# Altium footprint library SMD_SEMI.PcbLib: 101 footprints (part 2 of 7)
Each footprint in its own frame and in the unit in brackets; x right, y up, seen from the top. Pads: shape width x height; smd on the part's side, far side on the other; paste and mask are expansions set on the pad; w line width, h text height; cw(c..) or ccw(c..) is an arc to the next point about the centre after c.
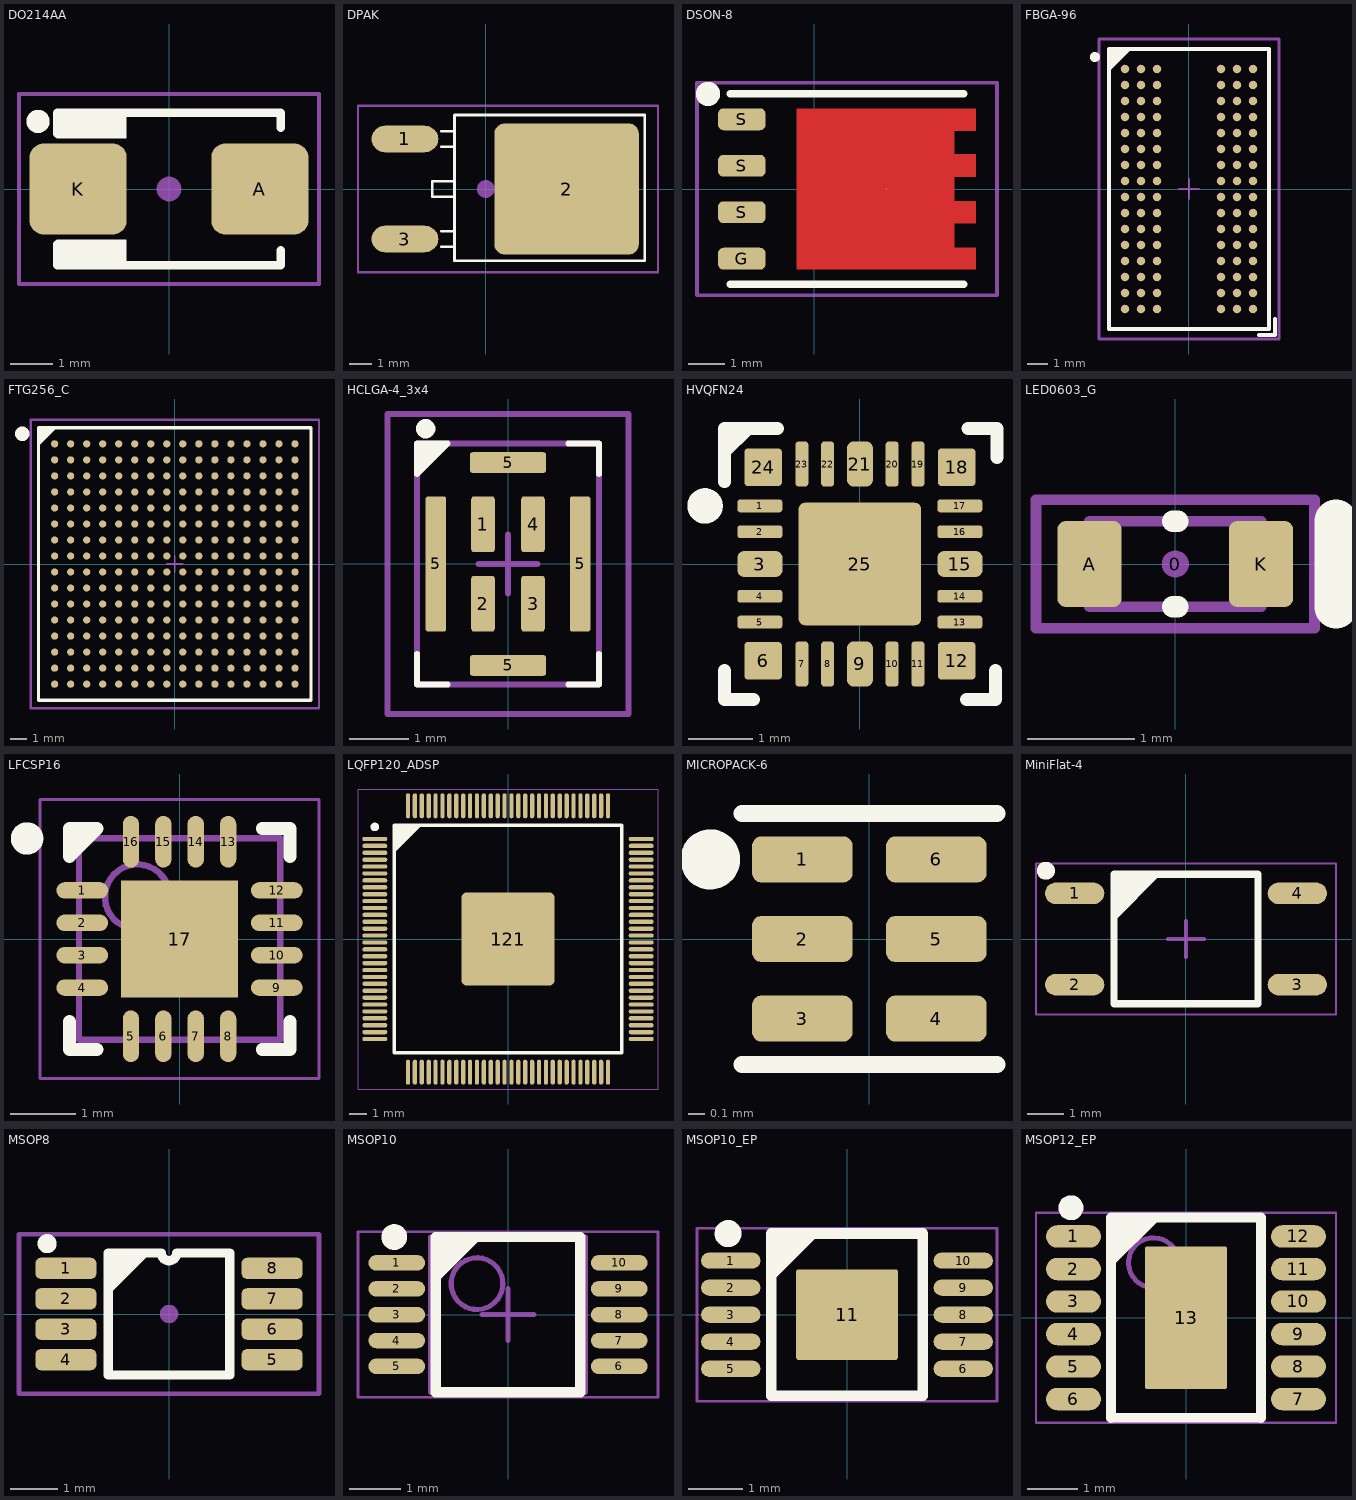
[diagram p1: the footprints below, top view; thin cyan lines are the x and y axes]

## DO214AA [mm]
pads (2):
  rrect30% 2.3x2.15 smd: A(2.15,0) K(-2.15,0)
Top Overlay:
  circle w0.3: c-3.1,1.6 r0.125
  rectangle: -2.659,1.2 -1,1.8
  rectangle: -2.659,-1.8 -1,-1.2
  lines w0.2: -2.65,-1.304 -2.65,-1.8 2.65,-1.8 2.65,-1.45 ; -2.65,1.304 -2.65,1.8 2.65,1.8 2.65,1.45
Mechanical 15:
  circle w0.3: c0,0 r0.141
  lines w0.1: -3.55,-2.25 3.55,-2.25 3.55,2.25 -3.55,2.25 -3.55,-2.25
3D body "DIOM5336X240N.stp": height 2.4, standoff 0, extent -2.7,-1.95 2.7,1.95

## DPAK [mm]
pads (3):
  oval 3x1.2 smd: 1(-3.637,2.25) 3(-3.637,-2.25)
  rrect15% 6.5x5.9 smd: 2(3.637,0)
Top Overlay:
  lines w0.127: -1.988,-2.6 -1.413,-2.6 ; -1.988,-1.9 -1.413,-1.9 ; -1.413,-0.35 -2.413,-0.35 -2.413,0.35 -1.413,0.35 ; -1.988,1.9 -1.413,1.9 -1.988,1.9 ; -1.988,2.6 -1.413,2.6 -1.988,2.6 ; -1.413,-3.225 -1.412,3.325 7.158,3.325 7.158,-3.225 -1.413,-3.225
Mechanical 15:
  circle w0.4: c0,0 r0.2
  lines w0.1: -5.75,-3.75 -5.75,3.75 7.75,3.75 7.75,-3.75 -5.75,-3.75
3D body "User Library-DPAK-1.step": height 2.41, standoff 0, extent -4.14,-3.23 5.799,3.31

## DSON-8 [mm]
pads (5):
  round 0.025 smd: D(1.975,0.001)
  rrect50% 1.3x0.6 smd: G(-1.975,-1.905) S(-1.975,-0.635) S(-1.975,0.635) S(-1.975,1.905)
Top Layer:
  region: -0.475,-2.193 4.425,-2.193 4.425,-1.608 3.825,-1.608 3.825,-0.931 4.425,-0.931 4.425,-0.33 3.825,-0.33 3.825,0.331 4.425,0.331 4.425,0.943 3.825,0.943 3.825,1.595 4.425,1.595 4.425,2.195 -0.475,2.195
Top Overlay:
  circle w0.4: c-2.9,2.6 r0.13
  lines w0.2: -2.3,-2.6 4.1,-2.6 ; -2.3,2.6 4.1,2.6
Mechanical 15:
  circle w0.4: c0,0 r0.141
  lines w0.1: -3.2,-2.9 5,-2.9 5,2.9 -3.2,2.9 -3.2,-2.75 -3.2,-2.9
3D body "User Library-TDSON-8.STEP": height 1.1, standoff -0.01, extent -2.275,-2.575 4.075,2.575

## FBGA-96 [mm]
height 1.6
pads (96):
  round 0.426 smd: A1(-3.2,6) A2(-2.4,6) A3(-1.6,6) A7(1.6,6) A8(2.4,6) A9(3.2,6) B1(-3.2,5.2) B2(-2.4,5.2) B3(-1.6,5.2) B7(1.6,5.2) B8(2.4,5.2) B9(3.2,5.2) C1(-3.2,4.4) C2(-2.4,4.4) C3(-1.6,4.4) C7(1.6,4.4) C8(2.4,4.4) C9(3.2,4.4) D1(-3.2,3.6) D2(-2.4,3.6) D3(-1.6,3.6) D7(1.6,3.6) D8(2.4,3.6) D9(3.2,3.6) E1(-3.2,2.8) E2(-2.4,2.8) E3(-1.6,2.8) E7(1.6,2.8) E8(2.4,2.8) E9(3.2,2.8) F1(-3.2,2) F2(-2.4,2) F3(-1.6,2) F7(1.6,2) F8(2.4,2) F9(3.2,2) G1(-3.2,1.2) G2(-2.4,1.2) G3(-1.6,1.2) G7(1.6,1.2) G8(2.4,1.2) G9(3.2,1.2) H1(-3.2,0.4) H2(-2.4,0.4) H3(-1.6,0.4) H7(1.6,0.4) H8(2.4,0.4) H9(3.2,0.4) J1(-3.2,-0.4) J2(-2.4,-0.4) J3(-1.6,-0.4) J7(1.6,-0.4) J8(2.4,-0.4) J9(3.2,-0.4) K1(-3.2,-1.2) K2(-2.4,-1.2) K3(-1.6,-1.2) K7(1.6,-1.2) K8(2.4,-1.2) K9(3.2,-1.2) L1(-3.2,-2) L2(-2.4,-2) L3(-1.6,-2) L7(1.6,-2) L8(2.4,-2) L9(3.2,-2) M1(-3.2,-2.8) M2(-2.4,-2.8) M3(-1.6,-2.8) M7(1.6,-2.8) M8(2.4,-2.8) M9(3.2,-2.8) N1(-3.2,-3.6) N2(-2.4,-3.6) N3(-1.6,-3.6) N7(1.6,-3.6) N8(2.4,-3.6) N9(3.2,-3.6) P1(-3.2,-4.4) P2(-2.4,-4.4) P3(-1.6,-4.4) P7(1.6,-4.4) P8(2.4,-4.4) P9(3.2,-4.4) R1(-3.2,-5.2) R2(-2.4,-5.2) R3(-1.6,-5.2) R7(1.6,-5.2) R8(2.4,-5.2) R9(3.2,-5.2) T1(-3.2,-6) T2(-2.4,-6) T3(-1.6,-6) T7(1.6,-6) T8(2.4,-6) T9(3.2,-6)
Top Overlay:
  circle w0.3: c-4.7,6.6 r0.1
  region: -4,7 -4,6 -3,7
  lines w0.2: 3.5,-7.3 4.3,-7.3 4.3,-6.5 ; -4,6 -3,7 ; -4,6 -4,-7 4,-7 4,7 -3,7 ; -4,6 -4,7 -3,7
Top Solder:
  lines w0.2: 3.5,-7.3 4.3,-7.3 4.3,-6.5
Mechanical 13:
  lines w0.1: -4,6 -3,7 ; -4,-7 -4,7 4,7 4,-7 -4,-7
Mechanical 15:
  lines w0.1: -0.5,0 0.5,0 ; 0,-0.5 0,0.5
  lines w0.15: -4.5,-7.5 -4.5,7.5 4.5,7.5 4.5,-7.5 -4.5,-7.5
3D body "BGA96C80P9X16_800X1400X120.step": height 1.2, standoff 0, extent -4,-7 4,7

## FTG256_C [mm] "BGA, 256-Balls, Body 17x17mm, Pitch 1mm"
height 1.55
pads (256):
  round 0.45 smd: A1(-7.5,7.5) A2(-6.5,7.5) A3(-5.5,7.5) A4(-4.5,7.5) A5(-3.5,7.5) A6(-2.5,7.5) A7(-1.5,7.5) A8(-0.5,7.5) A9(0.5,7.5) A10(1.5,7.5) A11(2.5,7.5) A12(3.5,7.5) A13(4.5,7.5) A14(5.5,7.5) A15(6.5,7.5) A16(7.5,7.5) B1(-7.5,6.5) B2(-6.5,6.5) B3(-5.5,6.5) B4(-4.5,6.5) B5(-3.5,6.5) B6(-2.5,6.5) B7(-1.5,6.5) B8(-0.5,6.5) B9(0.5,6.5) B10(1.5,6.5) B11(2.5,6.5) B12(3.5,6.5) B13(4.5,6.5) B14(5.5,6.5) B15(6.5,6.5) B16(7.5,6.5) C1(-7.5,5.5) C2(-6.5,5.5) C3(-5.5,5.5) C4(-4.5,5.5) C5(-3.5,5.5) C6(-2.5,5.5) C7(-1.5,5.5) C8(-0.5,5.5) C9(0.5,5.5) C10(1.5,5.5) C11(2.5,5.5) C12(3.5,5.5) C13(4.5,5.5) C14(5.5,5.5) C15(6.5,5.5) C16(7.5,5.5) D1(-7.5,4.5) D2(-6.5,4.5) D3(-5.5,4.5) D4(-4.5,4.5) D5(-3.5,4.5) D6(-2.5,4.5) D7(-1.5,4.5) D8(-0.5,4.5) D9(0.5,4.5) D10(1.5,4.5) D11(2.5,4.5) D12(3.5,4.5) D13(4.5,4.5) D14(5.5,4.5) D15(6.5,4.5) D16(7.5,4.5) E1(-7.5,3.5) E2(-6.5,3.5) E3(-5.5,3.5) E4(-4.5,3.5) E5(-3.5,3.5) E6(-2.5,3.5) E7(-1.5,3.5) E8(-0.5,3.5) E9(0.5,3.5) E10(1.5,3.5) E11(2.5,3.5) E12(3.5,3.5) E13(4.5,3.5) E14(5.5,3.5) E15(6.5,3.5) E16(7.5,3.5) F1(-7.5,2.5) F2(-6.5,2.5) F3(-5.5,2.5) F4(-4.5,2.5) F5(-3.5,2.5) F6(-2.5,2.5) F7(-1.5,2.5) F8(-0.5,2.5) F9(0.5,2.5) F10(1.5,2.5) F11(2.5,2.5) F12(3.5,2.5) F13(4.5,2.5) F14(5.5,2.5) F15(6.5,2.5) F16(7.5,2.5) G1(-7.5,1.5) G2(-6.5,1.5) G3(-5.5,1.5) G4(-4.5,1.5) G5(-3.5,1.5) G6(-2.5,1.5) G7(-1.5,1.5) G8(-0.5,1.5) G9(0.5,1.5) G10(1.5,1.5) G11(2.5,1.5) G12(3.5,1.5) G13(4.5,1.5) G14(5.5,1.5) G15(6.5,1.5) G16(7.5,1.5) H1(-7.5,0.5) H2(-6.5,0.5) H3(-5.5,0.5) H4(-4.5,0.5) H5(-3.5,0.5) H6(-2.5,0.5) H7(-1.5,0.5) H8(-0.5,0.5) H9(0.5,0.5) H10(1.5,0.5) H11(2.5,0.5) H12(3.5,0.5) H13(4.5,0.5) H14(5.5,0.5) H15(6.5,0.5) H16(7.5,0.5) J1(-7.5,-0.5) J2(-6.5,-0.5) J3(-5.5,-0.5) J4(-4.5,-0.5) J5(-3.5,-0.5) J6(-2.5,-0.5) J7(-1.5,-0.5) J8(-0.5,-0.5) J9(0.5,-0.5) J10(1.5,-0.5) J11(2.5,-0.5) J12(3.5,-0.5) J13(4.5,-0.5) J14(5.5,-0.5) J15(6.5,-0.5) J16(7.5,-0.5) K1(-7.5,-1.5) K2(-6.5,-1.5) K3(-5.5,-1.5) K4(-4.5,-1.5) K5(-3.5,-1.5) K6(-2.5,-1.5) K7(-1.5,-1.5) K8(-0.5,-1.5) K9(0.5,-1.5) K10(1.5,-1.5) K11(2.5,-1.5) K12(3.5,-1.5) K13(4.5,-1.5) K14(5.5,-1.5) K15(6.5,-1.5) K16(7.5,-1.5) L1(-7.5,-2.5) L2(-6.5,-2.5) L3(-5.5,-2.5) L4(-4.5,-2.5) L5(-3.5,-2.5) L6(-2.5,-2.5) L7(-1.5,-2.5) L8(-0.5,-2.5) L9(0.5,-2.5) L10(1.5,-2.5) L11(2.5,-2.5) L12(3.5,-2.5) L13(4.5,-2.5) L14(5.5,-2.5) L15(6.5,-2.5) L16(7.5,-2.5) M1(-7.5,-3.5) M2(-6.5,-3.5) M3(-5.5,-3.5) M4(-4.5,-3.5) M5(-3.5,-3.5) M6(-2.5,-3.5) M7(-1.5,-3.5) M8(-0.5,-3.5) M9(0.5,-3.5) M10(1.5,-3.5) M11(2.5,-3.5) M12(3.5,-3.5) M13(4.5,-3.5) M14(5.5,-3.5) M15(6.5,-3.5) M16(7.5,-3.5) N1(-7.5,-4.5) N2(-6.5,-4.5) N3(-5.5,-4.5) N4(-4.5,-4.5) N5(-3.5,-4.5) N6(-2.5,-4.5) N7(-1.5,-4.5) N8(-0.5,-4.5) N9(0.5,-4.5) N10(1.5,-4.5) N11(2.5,-4.5) N12(3.5,-4.5) N13(4.5,-4.5) N14(5.5,-4.5) N15(6.5,-4.5) N16(7.5,-4.5) P1(-7.5,-5.5) P2(-6.5,-5.5) P3(-5.5,-5.5) P4(-4.5,-5.5) P5(-3.5,-5.5) P6(-2.5,-5.5) P7(-1.5,-5.5) P8(-0.5,-5.5) P9(0.5,-5.5) P10(1.5,-5.5) P11(2.5,-5.5) P12(3.5,-5.5) P13(4.5,-5.5) P14(5.5,-5.5) P15(6.5,-5.5) P16(7.5,-5.5) R1(-7.5,-6.5) R2(-6.5,-6.5) R3(-5.5,-6.5) R4(-4.5,-6.5) R5(-3.5,-6.5) R6(-2.5,-6.5) R7(-1.5,-6.5) R8(-0.5,-6.5) R9(0.5,-6.5) R10(1.5,-6.5) R11(2.5,-6.5) R12(3.5,-6.5) R13(4.5,-6.5) R14(5.5,-6.5) R15(6.5,-6.5) R16(7.5,-6.5) T1(-7.5,-7.5) T2(-6.5,-7.5) T3(-5.5,-7.5) T4(-4.5,-7.5) T5(-3.5,-7.5) T6(-2.5,-7.5) T7(-1.5,-7.5) T8(-0.5,-7.5) T9(0.5,-7.5) T10(1.5,-7.5) T11(2.5,-7.5) T12(3.5,-7.5) T13(4.5,-7.5) T14(5.5,-7.5) T15(6.5,-7.5) T16(7.5,-7.5)
Top Overlay:
  circle w0.5: c-9.525,8.128 r0.2
  region: -7.5,8.5 -8.5,7.5 -8.5,8.5
  lines w0.2: -8.5,7.5 -7.5,8.5 ; -8.5,-8.5 -8.5,8.5 8.5,8.5 8.5,-8.5 -8.5,-8.5
Mechanical 13:
  lines w0.1: -8.5,-8.5 8.5,-8.5 8.5,8.5 -8.5,8.5 -8.5,-8.5
Mechanical 15:
  lines w0.1: -0.5,0 0.5,0 ; 0,-0.5 0,0.5
  lines w0.15: -9,-9 9,-9 9,9 -9,9 -9,-9
3D body "ARTIX-7s-FTG256.step": height 1.4, standoff 0, extent -8.5,-8.5 8.5,8.5

## HCLGA-4_3x4 [mm]
pads (8):
  rrect25% 0.4x0.95 smd paste+0 mask+0: 1(-0.425,0.675) 2(-0.425,-0.675) 3(0.425,-0.675) 4(0.425,0.675)
  rrect25% 0.35x2.3 smd paste+0 mask+0: 5(-1.225,0) 5(1.225,0)
  rrect25% 1.3x0.35 smd paste+0 mask+0: 5(0,-1.725) 5(0,1.725)
Top Overlay:
  circle w0.254: c-1.4,2.3 r0.037
  region: -1.55,2.05 -1.55,1.525 -1.025,2.05
  lines w0.1: -1.55,-1.525 -1.55,-2.05 -1.025,-2.05 ; 1.025,-2.05 1.55,-2.05 1.55,-1.525 ; 1.025,2.05 1.55,2.05 1.55,1.525 ; -1.55,1.525 -1.55,2.05 -1.025,2.05 -1.55,1.525 ; -1.55,1.525 -1.55,1.525
Mechanical 13:
  lines w0.1: -2.05,-2.55 -2.05,2.55 2.05,2.55 2.05,-2.55 -2.05,-2.55 ; -1.55,-2.05 1.55,-2.05 1.55,2.05 -1.55,2.05 -1.55,-2.05
Mechanical 15:
  lines w0.1: -0.5,0 0.5,0 ; 0,-0.5 0,0.5 ; -2.05,-2.55 2.05,-2.55 2.05,2.55 -2.05,2.55 -2.05,-2.55
3D body "IC_STMicroelectronics_MP34DT05TR-A_eec.STEP": height 0.25, standoff 0, extent -2.05,-2.55 2.05,2.55

## HVQFN24 [mm]
pads (25):
  rrect50% 0.7x0.2 smd: 1(-1.55,0.9) 2(-1.55,0.5) 4(-1.55,-0.5) 5(-1.55,-0.9) 13(1.55,-0.9) 14(1.55,-0.5) 16(1.55,0.5) 17(1.55,0.9)
  rrect50% 0.7x0.4 smd: 3(-1.55,0) 15(1.55,0)
  rrect20% 0.584x0.584 smd: 6(-1.5,-1.5) 12(1.5,-1.5) 18(1.5,1.5) 24(-1.5,1.5)
  rrect50% 0.2x0.7 smd: 7(-0.9,-1.55) 8(-0.5,-1.55) 10(0.5,-1.55) 11(0.9,-1.55) 19(0.9,1.55) 20(0.5,1.55) 22(-0.5,1.55) 23(-0.9,1.55)
  rrect50% 0.4x0.7 smd: 9(0,-1.55) 21(0,1.55)
  rrect10% 1.9x1.9 smd: 25(0,0)
Top Overlay:
  circle w0.3: c-2.4,0.9 r0.125
  region: -1.601,2.1 -2.1,1.601 -2.1,2.1
  lines w0.2: -2.1,-1.65 -2.1,-2.1 -1.65,-2.1 ; -2.1,1.275 -2.1,2.1 -1.275,2.1 ; 1.65,-2.1 2.1,-2.1 2.1,-1.65 ; 1.675,2.1 2.125,2.1 2.125,1.65
Top Paste:
  region: 0.132,0.818 0.818,0.818 0.818,0.132 0.132,0.132
  region: -0.818,-0.132 -0.132,-0.132 -0.132,-0.818 -0.818,-0.818
  region: -0.818,0.818 -0.132,0.818 -0.132,0.132 -0.818,0.132
  region: 0.132,-0.132 0.818,-0.132 0.818,-0.818 0.132,-0.818
Top Solder:
  region: 0.75,-1.15 1.05,-1.15 1.05,-1.95 0.75,-1.95
  region: 0.35,-1.15 0.65,-1.15 0.65,-1.95 0.35,-1.95
  region: -0.25,-1.15 0.25,-1.15 0.25,-1.95 -0.25,-1.95
  region: -0.65,-1.15 -0.35,-1.15 -0.35,-1.95 -0.65,-1.95
  region: -1.05,-1.15 -0.75,-1.15 -0.75,-1.95 -1.05,-1.95
  region: -0.25,1.95 0.25,1.95 0.25,1.15 -0.25,1.15
  region: 0.35,1.95 0.65,1.95 0.65,1.15 0.35,1.15
  region: -0.65,1.95 -0.35,1.95 -0.35,1.15 -0.65,1.15
  region: 0.75,1.95 1.05,1.95 1.05,1.15 0.75,1.15
  region: -1.05,1.95 -0.75,1.95 -0.75,1.15 -1.05,1.15
  region: 1.15,0.25 1.95,0.25 1.95,-0.25 1.15,-0.25
  region: 1.15,-0.75 1.95,-0.75 1.95,-1.05 1.15,-1.05
  region: 1.15,-0.35 1.95,-0.35 1.95,-0.65 1.15,-0.65
  region: 1.15,0.65 1.95,0.65 1.95,0.35 1.15,0.35
  region: 1.15,1.05 1.95,1.05 1.95,0.75 1.15,0.75
  region: -1.95,1.05 -1.15,1.05 -1.15,0.75 -1.95,0.75
  region: -1.95,1.05 -1.15,1.05 -1.15,0.75 -1.95,0.75
  region: -1.95,1.05 -1.15,1.05 -1.15,0.75 -1.95,0.75
  region: -1.95,0.65 -1.15,0.65 -1.15,0.35 -1.95,0.35
  region: -1.95,-0.75 -1.15,-0.75 -1.15,-1.05 -1.95,-1.05
  region: -1.95,-0.35 -1.15,-0.35 -1.15,-0.65 -1.95,-0.65
  region: -1.95,0.25 -1.15,0.25 -1.15,-0.25 -1.95,-0.25
  region: -1,1 1,1 1,-1 -1,-1
3D body: height 1, standoff 0.05, extent -1.5,-1.5 1.5,1.5

## LED0603_G [mm] "SMD, 2-Leads, Body 0.8x1.6mm"
height 0.75
pads (3):
  round 0.254 on Mech15: 0(0,0)
  rrect25% 0.6x0.8 smd: A(-0.8,0) K(0.8,0)
Top Overlay:
  lines w0.2: -0.025,-0.4 0.025,-0.4 ; -0.025,0.4 0.025,0.4
  lines w0.4: 1.5,-0.4 1.5,0.4
Mechanical 13:
  rectangle: 0.508,-0.4 0.8,0.4
  lines w0.1: -0.8,-0.4 -0.8,0.4 0.8,0.4 0.8,-0.4 -0.8,-0.4
Mechanical 15:
  lines w0.1: -1.3,-0.6 1.3,-0.6 1.3,0.6 -1.3,0.6 -1.3,-0.6
3D body "User Library-LED_0603_G.STEP": height 0.6, standoff 0, extent -0.8,-0.4 0.8,0.4

## LFCSP16 [mm] "QFN, 16-Leads, Body 3x3mm, Pitch 0.5mm, Thermal Pad 1.75x1.75mm, IPC Medium Density"
height 0.8
pads (17):
  oval 0.8x0.25 smd: 1(-1.5,0.75) 2(-1.5,0.25) 3(-1.5,-0.25) 4(-1.5,-0.75) 9(1.5,-0.75) 10(1.5,-0.25) 11(1.5,0.25) 12(1.5,0.75)
  oval 0.25x0.8 smd: 5(-0.75,-1.5) 6(-0.25,-1.5) 7(0.25,-1.5) 8(0.75,-1.5) 13(0.75,1.5) 14(0.25,1.5) 15(-0.25,1.5) 16(-0.75,1.5)
  rect 1.8x1.8 smd: 17(0,0)
Top Overlay:
  circle w0.25: c-2.35,1.55 r0.125
  rectangle: -1.7,1.488 -1.487,1.7
  lines w0.2: -1.7,-1.275 -1.7,-1.7 -1.275,-1.7 ; 1.275,-1.7 1.7,-1.7 1.7,-1.275 ; 1.275,1.7 1.7,1.7 1.7,1.275 ; -1.7,1.275 -1.7,1.7 -1.275,1.7 -1.7,1.275
Mechanical 13:
  circle w0.1: c-0.65,0.65 r0.5
  lines w0.1: -1.55,-1.55 1.55,-1.55 1.55,1.55 -1.55,1.55 -1.55,-1.55
Mechanical 15:
  lines w0.05: -2.15,-2.15 2.15,-2.15 2.15,2.15 -2.15,2.15 -2.15,-2.15
  lines w0.1: -0.5,0 0.5,0 ; 0,-0.5 0,0.5
3D body "User Library-ADP5074.step": height 0.72, standoff -0.03, extent -1.501,-1.501 1.501,1.501

## LQFP120_ADSP [mm] "TSQFP, 120-Leads, Body 14.00x14.00mm, Pitch 0.40mm, Thermal Pad 5.40x5.40mm, IPC Medium Density"
height 1.6
pads (121):
  oval 1.45x0.25 smd: 1(-7.725,5.8) 2(-7.725,5.4) 3(-7.725,5) 4(-7.725,4.6) 5(-7.725,4.2) 6(-7.725,3.8) 7(-7.725,3.4) 8(-7.725,3) 9(-7.725,2.6) 10(-7.725,2.2) 11(-7.725,1.8) 12(-7.725,1.4) 13(-7.725,1) 14(-7.725,0.6) 15(-7.725,0.2) 16(-7.725,-0.2) 17(-7.725,-0.6) 18(-7.725,-1) 19(-7.725,-1.4) 20(-7.725,-1.8) 21(-7.725,-2.2) 22(-7.725,-2.6) 23(-7.725,-3) 24(-7.725,-3.4) 25(-7.725,-3.8) 26(-7.725,-4.2) 27(-7.725,-4.6) 28(-7.725,-5) 29(-7.725,-5.4) 30(-7.725,-5.8) 61(7.725,-5.8) 62(7.725,-5.4) 63(7.725,-5) 64(7.725,-4.6) 65(7.725,-4.2) 66(7.725,-3.8) 67(7.725,-3.4) 68(7.725,-3) 69(7.725,-2.6) 70(7.725,-2.2) 71(7.725,-1.8) 72(7.725,-1.4) 73(7.725,-1) 74(7.725,-0.6) 75(7.725,-0.2) 76(7.725,0.2) 77(7.725,0.6) 78(7.725,1) 79(7.725,1.4) 80(7.725,1.8) 81(7.725,2.2) 82(7.725,2.6) 83(7.725,3) 84(7.725,3.4) 85(7.725,3.8) 86(7.725,4.2) 87(7.725,4.6) 88(7.725,5) 89(7.725,5.4) 90(7.725,5.8)
  oval 0.25x1.45 smd: 31(-5.8,-7.725) 32(-5.4,-7.725) 33(-5,-7.725) 34(-4.6,-7.725) 35(-4.2,-7.725) 36(-3.8,-7.725) 37(-3.4,-7.725) 38(-3,-7.725) 39(-2.6,-7.725) 40(-2.2,-7.725) 41(-1.8,-7.725) 42(-1.4,-7.725) 43(-1,-7.725) 44(-0.6,-7.725) 45(-0.2,-7.725) 46(0.2,-7.725) 47(0.6,-7.725) 48(1,-7.725) 49(1.4,-7.725) 50(1.8,-7.725) 51(2.2,-7.725) 52(2.6,-7.725) 53(3,-7.725) 54(3.4,-7.725) 55(3.8,-7.725) 56(4.2,-7.725) 57(4.6,-7.725) 58(5,-7.725) 59(5.4,-7.725) 60(5.8,-7.725) 91(5.8,7.725) 92(5.4,7.725) 93(5,7.725) 94(4.6,7.725) 95(4.2,7.725) 96(3.8,7.725) 97(3.4,7.725) 98(3,7.725) 99(2.6,7.725) 100(2.2,7.725) 101(1.8,7.725) 102(1.4,7.725) 103(1,7.725) 104(0.6,7.725) 105(0.2,7.725) 106(-0.2,7.725) 107(-0.6,7.725) 108(-1,7.725) 109(-1.4,7.725) 110(-1.8,7.725) 111(-2.2,7.725) 112(-2.6,7.725) 113(-3,7.725) 114(-3.4,7.725) 115(-3.8,7.725) 116(-4.2,7.725) 117(-4.6,7.725) 118(-5,7.725) 119(-5.4,7.725) 120(-5.8,7.725)
  rrect10% 5.4x5.4 smd: 121(0,0)
Top Overlay:
  circle w0.25: c-7.725,6.5 r0.125
  region: -6.55,6.55 -5.05,6.55 -6.55,5.05
  lines w0.2: -6.6,-6.6 -6.6,6.6 6.6,6.6 6.6,-6.6 -6.6,-6.6
Top Courtyard:
  lines w0.1: -0.5,0 0.5,0 ; 0,-0.5 0,0.5
Top Component Outline:
  lines w0.05: -8.7,-8.7 8.7,-8.7 8.7,8.7 -8.7,8.7 -8.7,-8.7
3D body "IC_Analog_Devices_ADSP-21565KSWZ8_eec.STEP": height 1.6, standoff 0, extent -8.009,-8.009 8.009,8.009

## MICROPACK-6 [mm]
pads (6):
  rrect40% 0.6x0.275 smd: 1(-0.4,0.475) 2(-0.4,0) 3(-0.4,-0.475) 4(0.4,-0.475) 5(0.4,0) 6(0.4,0.475)
Top Overlay:
  circle w0.2: c-0.95,0.475 r0.079
  lines w0.1: -0.762,-0.75 0.762,-0.75 ; -0.762,0.75 0.762,0.75
3D body "micropack-6.STEP": height 0.55, standoff -0.01, extent -0.5,-0.725 0.5,0.725

## MiniFlat-4 [mm]
height 2.2
pads (4):
  oval 1.65x0.6 smd: 1(-3.1,1.27) 2(-3.1,-1.27) 3(3.1,-1.27) 4(3.1,1.27)
Top Overlay:
  circle w0.25: c-3.9,1.9 r0.125
  region: -0.7,1.8 -2,0.5 -2,1.8
  lines w0.2: -2,-1.8 2,-1.8 2,1.8 -2,1.8 -2,-1.8
Mechanical 15:
  lines w0.05: -4.175,-2.1 4.175,-2.1 4.175,2.1 -4.175,2.1 -4.175,-2.1
  lines w0.1: -0.5,0 0.5,0 ; 0,-0.5 0,0.5
3D body "User Library-Mini-Flat Package (Avago).STEP": height 2.1, standoff 0, extent -3.5,-1.8 3.5,1.8

## MSOP8 [mm]
height 3.1
pads (8):
  rrect50% 1.3x0.45 smd: 1(-2.2,0.975) 2(-2.2,0.325) 3(-2.2,-0.325) 4(-2.2,-0.975) 5(2.2,-0.975) 6(2.2,-0.325) 7(2.2,0.325) 8(2.2,0.975)
Top Overlay:
  circle w0.254: c-2.6,1.5 r0.076
  region: -0.4,1.3 -1.3,0.4 -1.3,1.3
  lines w0.2: -1.3,-1.3 1.3,-1.3 1.3,1.3 0.162,1.3 cw(c0,1.3) -0.162,1.3 -1.3,1.3 -1.3,-1.3
Top Component Outline:
  circle w0.254: c0,0 r0.07
  lines w0.1: -3.2,-1.7 -3.2,1.7 0,1.7 3.2,1.7 3.2,-1.7 -3.2,-1.7
3D body "User Library-MSOP-8-1.step": height 0.92, standoff 0, extent -2.5,-1.5 2.5,1.5

## MSOP10 [mm]
height 0.86
pads (10):
  oval 1.1x0.3 smd: 1(-2.15,1) 2(-2.15,0.5) 3(-2.15,0) 4(-2.15,-0.5) 5(-2.15,-1) 6(2.15,-1) 7(2.15,-0.5) 8(2.15,0) 9(2.15,0.5) 10(2.15,1)
Top Overlay:
  circle w0.25: c-2.2,1.5 r0.125
  region: -0.5,1.5 -1.4,0.6 -1.4,1.5
  lines w0.2: -1.4,-1.5 -1.4,1.5 -1.2,1.5 1.4,1.5 1.4,-1.5 -1.4,-1.5
Mechanical 13:
  circle w0.1: c-0.6,0.6 r0.5
  lines w0.1: -1.5,-1.5 1.5,-1.5 1.5,1.5 -1.5,1.5 -1.5,-1.5
Mechanical 15:
  lines w0.05: -2.9,-1.6 2.9,-1.6 2.9,1.6 -2.9,1.6 -2.9,-1.6
  lines w0.1: -0.5,0 0.5,0 ; 0,-0.5 0,0.5
3D body "MSOP10.step": height 0.86, standoff 0, extent -2.45,-1.5 2.45,1.5

## MSOP10_EP [mm]
height 0.86
pads (11):
  oval 1.1x0.3 smd: 1(-2.15,1) 2(-2.15,0.5) 3(-2.15,0) 4(-2.15,-0.5) 5(-2.15,-1) 6(2.15,-1) 7(2.15,-0.5) 8(2.15,0) 9(2.15,0.5) 10(2.15,1)
  rrect5% 1.88x1.68 smd: 11(0,0)
Top Overlay:
  circle w0.25: c-2.2,1.5 r0.125
  region: -0.5,1.5 -1.4,0.6 -1.4,1.5
  lines w0.2: -1.4,-1.5 1.4,-1.5 1.4,1.5 -1.2,1.5 -1.4,1.5 -1.4,-1.5
Mechanical 15:
  lines w0.05: -2.775,-1.6 -2.775,1.6 2.775,1.6 2.775,-1.6 -2.775,-1.6
  lines w0.1: -0.5,0 0.5,0 ; 0,-0.5 0,0.5
3D body "MSOP10.step": height 0.86, standoff 0, extent -2.45,-1.5 2.45,1.5

## MSOP12_EP [mm]
height 1.1
pads (13):
  oval 1.1x0.45 smd: 1(-2.25,1.625) 2(-2.25,0.975) 3(-2.25,0.325) 4(-2.25,-0.325) 5(-2.25,-0.975) 6(-2.25,-1.625) 7(2.25,-1.625) 8(2.25,-0.975) 9(2.25,-0.325) 10(2.25,0.325) 11(2.25,0.975) 12(2.25,1.625)
  rrect5% 1.65x2.85 smd: 13(0,0)
Top Overlay:
  circle w0.25: c-2.3,2.2 r0.125
  region: -0.5,2 -1.5,1 -1.5,2
  lines w0.2: -1.5,-2 1.5,-2 1.5,2 -1.5,2 -1.5,-2
Mechanical 13:
  circle w0.1: c-0.65,1.1 r0.5
  lines w0.1: -1.55,-2 1.55,-2 1.55,2 -1.55,2 -1.55,-2
Mechanical 15:
  lines w0.05: -3,-2.1 3,-2.1 3,2.1 -3,2.1 -3,-2.1
  lines w0.1: -0.5,0 0.5,0 ; 0,-0.5 0,0.5
3D body "MSOP12_EP.step": height 1.1, standoff 0, extent -2.45,-2 2.45,2